# Altium footprint library ParsaLibrary.PcbLib: 526 footprints (part 5 of 33)
Each footprint in its own frame and in the unit in brackets; x right, y up, seen from the top. Pads: shape width x height; smd on the part's side, far side on the other; paste and mask are expansions set on the pad; w line width, h text height; cw(c..) or ccw(c..) is an arc to the next point about the centre after c.
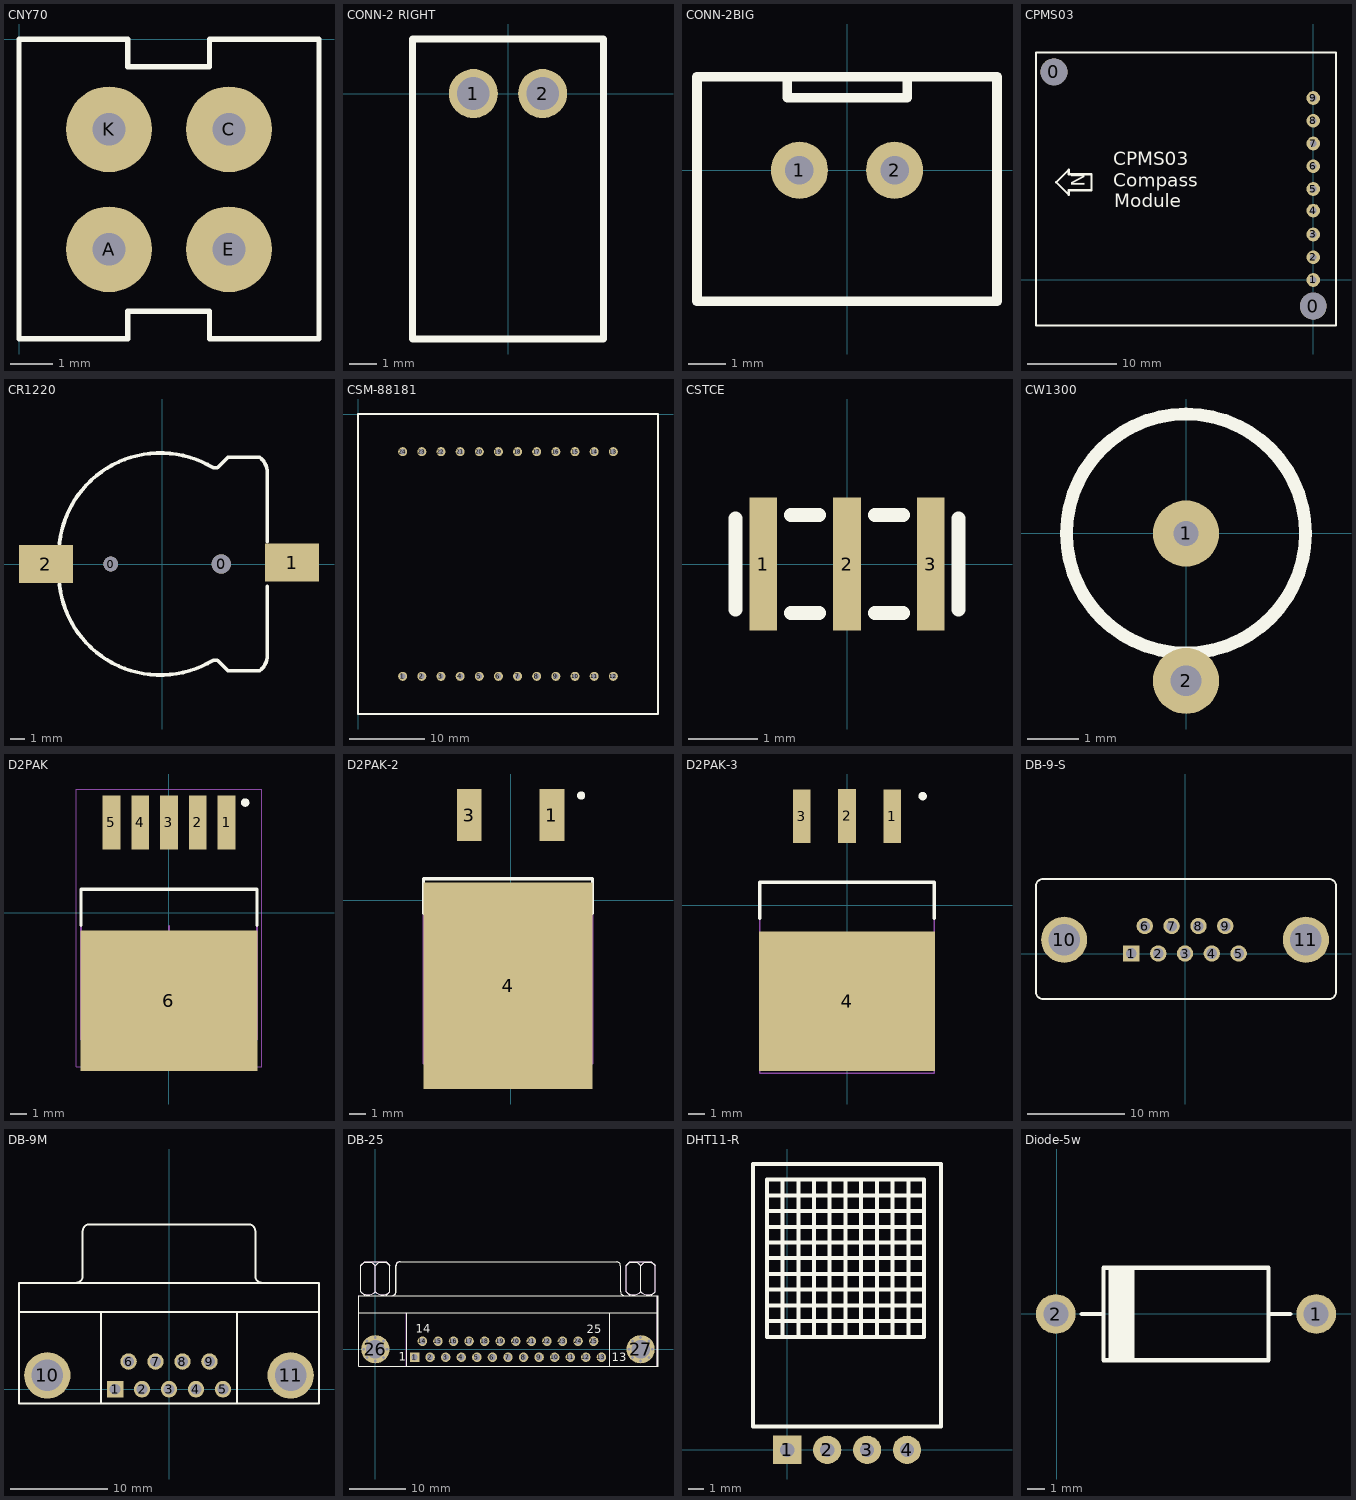
[diagram p4: the footprints below, top view; thin cyan lines are the x and y axes]

## CNY70 [mm]
pads (4):
  round 2 hole 0.762: A(2.1,-4.9) C(4.9,-2.1) E(4.9,-4.9) K(2.1,-2.1)
Top Overlay:
  lines w0.127: 6.985,0 4.445,0 4.445,-0.635 2.54,-0.635 2.54,0 0,0 0,-6.985 2.54,-6.985 2.54,-6.35 4.445,-6.35 4.445,-6.985 7,-6.985 7,0
3D body "CNY70.STEP": height 6, standoff 0, extent -0.02,-6.96 6.98,0.04
3D body "pin 0.4x0.5.STEP": height 0, standoff -5, extent 1.884,-5.099 2.384,-4.699
3D body "pin 0.4x0.5.STEP": height 0, standoff -5, extent 4.68,-5.199 5.08,-4.699
3D body "pin 0.4x0.5.STEP": height 0, standoff -5, extent 1.88,-2.358 2.28,-1.858
3D body "pin 0.4x0.5.STEP": height 0, standoff -5, extent 4.702,-2.405 5.102,-1.905

## CONN-2 RIGHT [mm]
pads (2):
  round 1.8 hole 1.2: 1(-1.27,0) 2(1.27,0)
Top Overlay:
  lines w0.254: -3.5,-9 3.5,-9 3.5,2 -3.5,2 -3.5,-9
3D body "CONNECTOR RIGHT.STEP": height 5.5, standoff 0, extent -3.699,-9.119 3.801,2.881
3D body "pin right.STEP": height 3.9, standoff -2, extent 0.82,-8.468 1.72,0.432
3D body "pin right.STEP": height 3.9, standoff -2, extent -1.662,-8.519 -0.762,0.381

## CONN-2BIG [mil]
pads (2):
  round 60 hole 30: 1(-50,0) 2(50,0)
Top Overlay:
  lines w10: -62.5,98.43 -62.5,76.2 63.5,76.2 63.5,98.43 ; 157.46,-137.8 -157.5,-137.8 -157.5,98.43 157.46,98.43 ; 157.5,-137.8 157.5,98.43

## CPMS03 [mil]
pads (11):
  round 118.11 hole 118.11: 0(-1140,915) 0(0,-115)
  round 60 hole 30: 1(0,0) 2(0,100) 3(0,200) 4(0,305) 5(0,400) 6(0,500) 7(0,600) 8(0,700) 9(0,800)
Top Overlay:
  lines w10: -1218.9,-200 -1218.9,1000 100,1000 100,-200 -1218.9,-200 ; -1130,430 -1075,485 -1075,465 -975,465 -975,395 -1075,395 -1075,375 -1130,430
  text "Module" at -875,320 h60
  text "Compass" at -880,410 h60
  text "CPMS03" at -880,505 h60
  text "N" at -1005,410 h60

## CR1220 [mm]
pads (4):
  round 1 hole 1: 0(-3.5,0)
  round 1.3 hole 1.3: 0(4,0)
  rect 3.66x2.6 smd: 1(8.8,0.1) 2(-7.9,0)
Top Overlay:
  lines w0.254: -6.985,-1.397 ccw(c-0.127,-0.635) 3.465,-6.526 3.732,-6.526 4.45,-7.244 5.466,-7.244 6.608,-7.244 ccw(c5.842,-6.223) 7.112,-6.35 7.112,-1.524 ; -6.985,1.397 cw(c-0.127,0.635) 3.465,6.526 3.732,6.526 4.45,7.244 5.466,7.244 6.608,7.244 cw(c5.842,6.223) 7.112,6.35 7.112,1.524
3D body "User Library-Battery Holder for CR1220 SMD.step": height 4.28, standoff -0.47, extent -8.9,-7.4 9.9,7.349

## CSM-88181 [mm]
height 8.5
pads (24):
  round 1.2 hole 0.7: 1(5.93,-34.8) 2(8.47,-34.8) 3(11.01,-34.8) 4(13.55,-34.8) 5(16.09,-34.8) 6(18.63,-34.8) 7(21.17,-34.8) 8(23.71,-34.8) 9(26.25,-34.8) 10(28.79,-34.8) 11(31.33,-34.8) 12(33.87,-34.8) 13(33.87,-5) 14(31.33,-5) 15(28.79,-5) 16(26.25,-5) 17(23.71,-5) 18(21.17,-5) 19(18.63,-5) 20(16.09,-5) 21(13.55,-5) 22(11.01,-5) 23(8.47,-5) 24(5.93,-5)
Top Overlay:
  lines w0.2: 0,-39.8 0,0 39.8,0 39.8,-39.8 0,-39.8

## CSTCE [mm]
pads (3):
  rect 0.4x1.9 smd: 1(-1.2,0) 2(0,0) 3(1.2,0)
Top Overlay:
  lines w0.2: -1.6,-0.65 -1.6,0.65 ; -0.8,-0.7 -0.4,-0.7 ; -0.8,0.7 -0.4,0.7 ; 0.4,-0.7 0.8,-0.7 ; 0.4,0.7 0.8,0.7 ; 1.6,-0.65 1.6,0.65
3D body "User Library-CSTCE.step": height 0.7, standoff 0, extent -1.6,-0.65 1.6,0.65

## CW1300 [mm]
pads (2):
  round 1.3 hole 0.5: 1(0,0)
  round 1.3 hole 0.6: 2(0,-2.9)
Top Overlay:
  circle w0.254: c0,0 r2.35

## D2PAK [mm]
pads (6):
  rect 1.05x3.2 smd: 1(3.4,5.325) 2(1.7,5.325) 3(0,5.325) 4(-1.7,5.325) 5(-3.4,5.325)
  rect 10.45x8.3 smd: 6(0,-5.207)
Top Overlay:
  circle w0.25: c4.5,6.5 r0.125
  lines w0.2: -5.2,-0.762 -5.2,1.375 5.2,1.375 5.2,-0.762
Mechanical 13:
  lines w0.1: -5.2,-7.515 5.2,-7.515 5.2,1.375 -5.2,1.375 -5.2,-7.515
Mechanical 15:
  lines w0.05: -5.475,-9.125 5.475,-9.125 5.475,7.3 -5.475,7.3 -5.475,-9.125
  lines w0.1: -0.5,-1.275 0.5,-1.275 ; 0,-1.775 0,-0.775
3D body "TO263-5-1.stp": height 4.22, standoff 0, extent -4.911,-8.602 4.911,6

## D2PAK-2 [mm]
pads (3):
  rect 1.524x3.2 smd: 1(2.54,5.25) 3(-2.54,5.25)
  rect 10.414x12.7 smd: 4(-0.16,-5.25)
Top Overlay:
  circle w0.25: c4.34,6.45 r0.125
  lines w0.2: -5.36,-0.812 -5.36,1.325 5.04,1.325 5.04,-0.812
Mechanical 13:
  lines w0.1: -5.36,-10.05 5.04,-10.05 5.04,1.325 -5.36,1.325 -5.36,-10.05
3D body "User Library-D2PAK.step": height 4.83, standoff 0, extent -5.5,-9.78 5.17,6.1

## D2PAK-3 [mm] "TO-263  3-Lead Middle Pin Long"
pads (4):
  rect 1.05x3.2 smd: 1(2.7,5.3) 2(0,5.325) 3(-2.7,5.3)
  rect 10.45x8.3 smd: 4(0,-5.707)
Top Overlay:
  circle w0.25: c4.5,6.5 r0.125
  lines w0.2: -5.2,-0.762 -5.2,1.375 5.2,1.375 5.2,-0.762
Mechanical 13:
  lines w0.1: -5.2,-10 -5.2,1.375 5.2,1.375 5.2,-10 -5.2,-10
3D body "User Library-TO263-3-1.STEP": height 4.6, standoff -0.03, extent -5.2,-9.425 5.2,6.425

## DB-9-S [mm]
pads (11):
  rect 1.69x1.69 hole 1.09: 1(-5.54,0)
  round 1.69 hole 1.09: 2(-2.77,0) 3(0,0) 4(2.77,0) 5(5.54,0) 6(-4.155,2.84) 7(-1.385,2.84) 8(1.385,2.84) 9(4.155,2.84)
  round 4.76 hole 3.26: 10(-12.495,1.42) 11(12.495,1.42)
Top Overlay:
  lines w0.2: -15.4,-4.005 -15.4,7.005 ; -15.395,-4.005 ccw(c-14.7,-4.005) -14.7,-4.7 14.905,-4.7 ; -15.395,7.005 cw(c-14.7,7.005) -14.7,7.7 14.9,7.7 cw(c14.9,7.005) 15.595,7.005 ; 14.905,-4.695 ccw(c14.905,-4) 15.6,-4 15.6,7.005
3D body "User Library-con-116-1.step": height 11.8, standoff -5.1, extent -15.399,-4.7 15.6,7.7

## DB-9M [mm]
pads (11):
  rect 1.69x1.69 hole 1.09: 1(-5.54,0)
  round 1.69 hole 1.09: 2(-2.77,0) 3(0,0) 4(2.77,0) 5(5.54,0) 6(-4.155,2.84) 7(-1.385,2.84) 8(1.385,2.84) 9(4.155,2.84)
  round 4.76 hole 3.26: 10(-12.495,1.42) 11(12.495,1.42)
Top Overlay:
  lines w0.2: -15.4,7.92 15.4,7.92 ; -9.56,10.925 ccw(c-9.56,11.62) -8.865,11.62 -8.865,16.22 ; -8.86,16.225 cw(c-8.165,16.225) -8.165,16.92 8.165,16.92 cw(c8.165,16.225) 8.86,16.225 ; -7,-1.48 -7,7.92 ; 7,-1.48 7,7.92 ; 8.865,16.22 8.865,11.62 ccw(c9.56,11.62) 9.56,10.925 ; -15.4,-1.48 15.4,-1.48 15.4,10.92 -15.4,10.92 -15.4,-1.48
3D body "User Library-DB9-Usa.step": height 12.27, standoff -4.6, extent -15.41,-1.45 15.4,16.85

## DB-25 [mm]
pads (43):
  rect 1.69x1.69 hole 1.09: 1(6.96,-1.42)
  round 1.69 hole 1.09: 2(9.721,-1.42) 3(12.482,-1.42) 4(15.243,-1.42) 5(18.004,-1.42) 6(20.765,-1.42) 7(23.526,-1.42) 8(26.287,-1.42) 9(29.048,-1.42) 10(31.809,-1.42) 11(34.57,-1.42) 12(37.331,-1.42) 13(40.092,-1.42) 14(8.34,1.42) 15(11.101,1.42) 16(13.862,1.42) 17(16.623,1.42) 18(19.384,1.42) 19(22.145,1.42) 20(24.906,1.42) 21(27.667,1.42) 22(30.428,1.42) 23(33.189,1.42) 24(35.95,1.42) 25(38.711,1.42)
  round 0.8 hole 0.5: 26(-2.06,0) 26(-1.457,-1.457) 26(-1.457,1.457) 26(0,-2.06) 26(0,2.06) 26(1.457,-1.457) 26(1.457,1.457) 26(2.06,0) 27(44.992,0) 27(45.595,-1.457) 27(45.595,1.457) 27(47.052,-2.06) 27(47.052,2.06) 27(48.509,-1.457) 27(48.509,1.457) 27(49.112,0)
  round 5 hole 3.26: 26(0,0) 27(47.052,0)
Top Overlay:
  lines w0.2: -2.97,6.5 50.13,6.5 ; -2.543,14.85 -2.543,10.199 -1.908,9.564 ; -2.543,14.865 -1.908,15.5 1.902,15.5 2.537,14.865 ; -0.003,10.199 -0.003,14.85 ; 1.902,9.564 2.537,10.199 2.537,14.85 ; 2.537,13.586 2.537,13.798 ; 2.935,9.505 ccw(c2.935,10.2) 3.63,10.2 3.63,14.8 ; 2.985,9.505 ccw(c2.985,10.2) 3.68,10.2 3.68,14.8 ; 3.635,14.805 cw(c4.33,14.805) 4.33,15.5 ; 3.685,14.805 cw(c4.38,14.805) 4.38,15.5 42.78,15.5 cw(c42.78,14.805) 43.475,14.805 ; 5.58,-3 5.58,6.5 ; 41.58,-3 41.58,6.5 ; 43.48,14.8 43.48,10.2 ccw(c44.175,10.2) 44.175,9.505 ; 44.519,14.85 44.519,10.199 45.154,9.564 ; 44.519,14.865 45.154,15.5 48.964,15.5 49.599,14.865 ; 47.059,10.199 47.059,14.85 ; 48.964,9.564 49.599,10.199 49.599,14.85 ; 49.599,13.586 49.599,13.798 ; 49.957,-2.9 49.957,9.5 ; -2.97,-3 -2.97,9.5 50.13,9.5 50.13,-3 -2.97,-3
  lines w0.203: -2.545,10.197 ccw(c-1.273,11.469) -0.001,10.197 ; -2.543,14.85 cw(c-1.271,13.578) 0.002,14.85 ; -0.007,14.85 cw(c1.265,13.578) 2.537,14.85 ; -0.005,10.197 ccw(c1.267,11.469) 2.539,10.197 ; 44.517,10.197 ccw(c45.789,11.469) 47.061,10.197 ; 44.519,14.85 cw(c45.791,13.578) 47.064,14.85 ; 47.055,14.85 cw(c48.327,13.578) 49.599,14.85 ; 47.057,10.197 ccw(c48.329,11.469) 49.601,10.197
  text "1" at 4.161,-2.06 h1.5
  text "25" at 37.5,2.8 h1.5
  text "14" at 7.2,2.9 h1.5
  text "13" at 41.9,-2.1 h1.5
Mechanical 1:
  lines w0.1: 2.935,9.505 ccw(c2.935,10.2) 3.63,10.2 ; 3.635,14.805 cw(c4.33,14.805) 4.33,15.5
Mechanical 13:
  lines w0.1: -2.905,-2.9 -2.905,9.5 ; -2.545,10.197 ccw(c-1.273,11.469) -0.001,10.197 ; -2.543,14.865 -1.908,15.5 1.902,15.5 2.537,14.865 ; -1.908,9.564 -2.543,10.199 -2.543,14.85 cw(c-1.271,13.578) 0.002,14.85 ; -0.007,14.85 cw(c1.265,13.578) 2.537,14.85 2.537,10.199 1.902,9.564 ; -0.005,10.197 ccw(c1.267,11.469) 2.539,10.197 ; -0.003,10.199 -0.003,14.85 ; 2.537,13.586 2.537,13.798 ; 3.63,10.2 3.63,14.8 ; 5.495,-2.9 5.495,6.5 ; 44.517,10.197 ccw(c45.789,11.469) 47.061,10.197 ; 44.519,14.865 45.154,15.5 48.964,15.5 49.599,14.865 ; 45.154,9.564 44.519,10.199 44.519,14.85 cw(c45.791,13.578) 47.064,14.85 ; 47.055,14.85 cw(c48.327,13.578) 49.599,14.85 49.599,10.199 48.964,9.564 ; 47.057,10.197 ccw(c48.329,11.469) 49.601,10.197 ; 47.059,10.199 47.059,14.85 ; 49.599,13.586 49.599,13.798 ; 49.957,-2.9 49.957,9.5
3D body "User Library-D-sub DB-25FB.STEP": height 12.5, standoff -4.66, extent -2.95,-2.862 50.15,15.542

## DHT11-R [mm]
pads (4):
  rect 1.8x1.8 hole 0.9: 1(0,0)
  round 1.8 hole 0.9: 2(2.54,0) 3(5.08,0) 4(7.62,0)
Top Overlay:
  lines w0.254: -1.3,7.2 -1.3,17.2 8.7,17.2 8.7,7.2 -1.292,7.2 ; -1.292,8.2 8.7,8.2 ; -1.292,9.2 8.7,9.2 ; -1.292,10.2 8.7,10.2 ; -1.292,11.2 8.7,11.2 ; -1.292,12.2 8.7,12.2 ; -1.292,13.2 8.7,13.2 ; -1.292,14.2 8.7,14.2 ; -1.292,15.2 8.7,15.2 ; -1.292,16.2 8.7,16.2 ; -0.3,7.2 -0.3,17.2 ; 0.7,7.2 0.7,17.2 ; 1.7,7.2 1.7,17.2 ; 2.7,7.2 2.7,17.2 ; 3.7,7.2 3.7,17.2 ; 4.7,7.2 4.7,17.2 ; 5.7,7.2 5.7,17.2 ; 6.7,7.2 6.7,17.2 ; 7.7,7.2 7.7,17.2 ; -2.2,1.5 -2.2,18.2 9.8,18.2 9.8,1.5 -2.2,1.5
3D body "User Library-DHT11-right.step": height 5.5, standoff -2.6, extent -2.2,-0.3 9.8,18.2

## Diode-5w [mil]
pads (2):
  round 90 hole 57: 1(588,-1) 2(-2,-1)
Top Overlay:
  region: 117.8,-106 117.8,104 175.28,104 175.28,-106
  lines w10: 56.78,-1 106,-1 ; 480,-1 529.22,-1 ; 106,-106 106,104 480,104 480,-106 106,-106
3D body "BYW98.STEP": height 254.33, standoff -86.22, extent -28.26,-104.15 613.47,104.51